# Altium integrated library WCAP-ATG8_rev15a.intlib: 195 symbols (part 2 of 2)
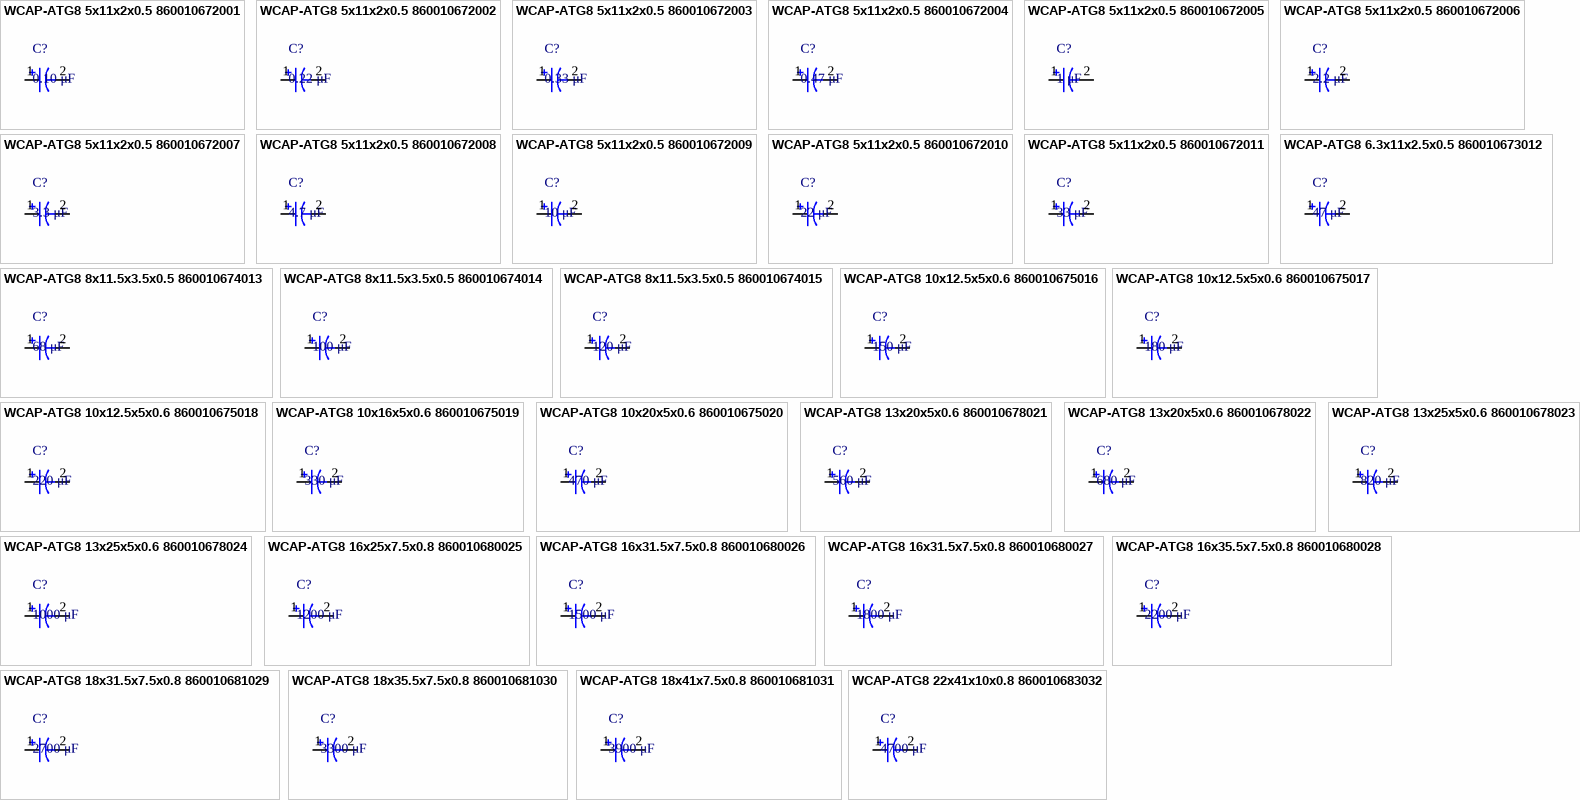
[diagram p7: symbols WCAP-ATG8 5x11x2x0.5 860010672001 to WCAP-ATG8 22x41x10x0.8 860010683032]

## WCAP-ATG8 5x11x2x0.5 860010672007
designator C?, comment 3.3 μF
WCAP-ATG8 Aluminum Electrolytic Capacitors , 3,3 μF; + / - 20%; 50 V , 5 x 11; Manufacturer: Wurth Elektronik; partNo: 860010672007; E-mail: libraries@we-online.com; Characteristics: Aluminum Electrolytic Capacitor; Recommended soldering: Wave; Operating temperature:–40 °C to +85 °C for UR < 400 V; 25 °C to +85 °C for UR ≥ 400 V; Wide capacitance value range; Load life: 2000 h @ +85 °C; ComponentLink1Description: Manufacturer; ComponentLink1URL: http://www.we-online.com; ComponentLink2Description: Datasheet; ComponentLink2URL: http://katalog.we-online.de/pbs/datasheet/860010672007.pdf; Created by: Karrer Zheng; Created Date: 6/8/2015; Capacitance: 3.3 μF; Application: Medium and high voltage type range from 160V-450V used as primary side input filter in power supply; Low voltage type used as energy storage or low frequency filtering in circuit, applied to general switching power supply, AC-DC converter, adapter, charger, TV, VCR, DC motor circuit filter, digital audio, digital cameras, digital video cameras, satellite receiver etc.
footprint WCAP-ATG8 5x11x2x0.5
pins: 1, 2

## WCAP-ATG8 5x11x2x0.5 860010672008
designator C?, comment 4.7 μF
WCAP-ATG8 Aluminum Electrolytic Capacitors , 4,7 μF; + / - 20%; 50 V , 5 x 11; Manufacturer: Wurth Elektronik; partNo: 860010672008; E-mail: libraries@we-online.com; Characteristics: Aluminum Electrolytic Capacitor; Recommended soldering: Wave; Operating temperature:–40 °C to +85 °C for UR < 400 V; 25 °C to +85 °C for UR ≥ 400 V; Wide capacitance value range; Load life: 2000 h @ +85 °C; ComponentLink1Description: Manufacturer; ComponentLink1URL: http://www.we-online.com; ComponentLink2Description: Datasheet; ComponentLink2URL: http://katalog.we-online.de/pbs/datasheet/860010672008.pdf; Created by: Karrer Zheng; Created Date: 6/8/2015; Capacitance: 4.7 μF; Application: Medium and high voltage type range from 160V-450V used as primary side input filter in power supply; Low voltage type used as energy storage or low frequency filtering in circuit, applied to general switching power supply, AC-DC converter, adapter, charger, TV, VCR, DC motor circuit filter, digital audio, digital cameras, digital video cameras, satellite receiver etc.
footprint WCAP-ATG8 5x11x2x0.5
pins: 1, 2

## WCAP-ATG8 5x11x2x0.5 860010672009
designator C?, comment 10 μF
WCAP-ATG8 Aluminum Electrolytic Capacitors , 10 μF; + / - 20%; 50 V , 5 x 11; Manufacturer: Wurth Elektronik; partNo: 860010672009; E-mail: libraries@we-online.com; Characteristics: Aluminum Electrolytic Capacitor; Recommended soldering: Wave; Operating temperature:–40 °C to +85 °C for UR < 400 V; 25 °C to +85 °C for UR ≥ 400 V; Wide capacitance value range; Load life: 2000 h @ +85 °C; ComponentLink1Description: Manufacturer; ComponentLink1URL: http://www.we-online.com; ComponentLink2Description: Datasheet; ComponentLink2URL: http://katalog.we-online.de/pbs/datasheet/860010672009.pdf; Created by: Karrer Zheng; Created Date: 6/8/2015; Capacitance: 10 μF; Application: Medium and high voltage type range from 160V-450V used as primary side input filter in power supply; Low voltage type used as energy storage or low frequency filtering in circuit, applied to general switching power supply, AC-DC converter, adapter, charger, TV, VCR, DC motor circuit filter, digital audio, digital cameras, digital video cameras, satellite receiver etc.
footprint WCAP-ATG8 5x11x2x0.5
pins: 1, 2

## WCAP-ATG8 5x11x2x0.5 860010672010
designator C?, comment 22 μF
WCAP-ATG8 Aluminum Electrolytic Capacitors , 22 μF; + / - 20%; 50 V , 5 x 11; Manufacturer: Wurth Elektronik; partNo: 860010672010; E-mail: libraries@we-online.com; Characteristics: Aluminum Electrolytic Capacitor; Recommended soldering: Wave; Operating temperature:–40 °C to +85 °C for UR < 400 V; 25 °C to +85 °C for UR ≥ 400 V; Wide capacitance value range; Load life: 2000 h @ +85 °C; ComponentLink1Description: Manufacturer; ComponentLink1URL: http://www.we-online.com; ComponentLink2Description: Datasheet; ComponentLink2URL: http://katalog.we-online.de/pbs/datasheet/860010672010.pdf; Created by: Karrer Zheng; Created Date: 6/8/2015; Capacitance: 22 μF; Application: Medium and high voltage type range from 160V-450V used as primary side input filter in power supply; Low voltage type used as energy storage or low frequency filtering in circuit, applied to general switching power supply, AC-DC converter, adapter, charger, TV, VCR, DC motor circuit filter, digital audio, digital cameras, digital video cameras, satellite receiver etc.
footprint WCAP-ATG8 5x11x2x0.5
pins: 1, 2

## WCAP-ATG8 5x11x2x0.5 860010672011
designator C?, comment 33 μF
WCAP-ATG8 Aluminum Electrolytic Capacitors , 33 μF; + / - 20%; 50 V , 5 x 11; Manufacturer: Wurth Elektronik; partNo: 860010672011; E-mail: libraries@we-online.com; Characteristics: Aluminum Electrolytic Capacitor; Recommended soldering: Wave; Operating temperature:–40 °C to +85 °C for UR < 400 V; 25 °C to +85 °C for UR ≥ 400 V; Wide capacitance value range; Load life: 2000 h @ +85 °C; ComponentLink1Description: Manufacturer; ComponentLink1URL: http://www.we-online.com; ComponentLink2Description: Datasheet; ComponentLink2URL: http://katalog.we-online.de/pbs/datasheet/860010672011.pdf; Created by: Karrer Zheng; Created Date: 6/8/2015; Capacitance: 33 μF; Application: Medium and high voltage type range from 160V-450V used as primary side input filter in power supply; Low voltage type used as energy storage or low frequency filtering in circuit, applied to general switching power supply, AC-DC converter, adapter, charger, TV, VCR, DC motor circuit filter, digital audio, digital cameras, digital video cameras, satellite receiver etc.
footprint WCAP-ATG8 5x11x2x0.5
pins: 1, 2

## WCAP-ATG8 6.3x11x2.5x0.5 860010673012
designator C?, comment 47 μF
WCAP-ATG8 Aluminum Electrolytic Capacitors , 47 μF; + / - 20%; 50 V , 6,3 x 11; Manufacturer: Wurth Elektronik; partNo: 860010673012; E-mail: libraries@we-online.com; Characteristics: Aluminum Electrolytic Capacitor; Recommended soldering: Wave; Operating temperature:–40 °C to +85 °C for UR < 400 V; 25 °C to +85 °C for UR ≥ 400 V; Wide capacitance value range; Load life: 2000 h @ +85 °C; ComponentLink1Description: Manufacturer; ComponentLink1URL: http://www.we-online.com; ComponentLink2Description: Datasheet; ComponentLink2URL: http://katalog.we-online.de/pbs/datasheet/860010673012.pdf; Created by: Karrer Zheng; Created Date: 6/8/2015; Capacitance: 47 μF; Application: Medium and high voltage type range from 160V-450V used as primary side input filter in power supply; Low voltage type used as energy storage or low frequency filtering in circuit, applied to general switching power supply, AC-DC converter, adapter, charger, TV, VCR, DC motor circuit filter, digital audio, digital cameras, digital video cameras, satellite receiver etc.
footprint WCAP-ATG8 6.3x11x2.5x0.5
pins: 1, 2

## WCAP-ATG8 8x11.5x3.5x0.5 860010674013
designator C?, comment 68 μF
WCAP-ATG8 Aluminum Electrolytic Capacitors , 68 μF; + / - 20%; 50 V , 8 x 11,5; Manufacturer: Wurth Elektronik; partNo: 860010674013; E-mail: libraries@we-online.com; Characteristics: Aluminum Electrolytic Capacitor; Recommended soldering: Wave; Operating temperature:–40 °C to +85 °C for UR < 400 V; 25 °C to +85 °C for UR ≥ 400 V; Wide capacitance value range; Load life: 2000 h @ +85 °C; ComponentLink1Description: Manufacturer; ComponentLink1URL: http://www.we-online.com; ComponentLink2Description: Datasheet; ComponentLink2URL: http://katalog.we-online.de/pbs/datasheet/860010674013.pdf; Created by: Karrer Zheng; Created Date: 6/8/2015; Capacitance: 68 μF; Application: Medium and high voltage type range from 160V-450V used as primary side input filter in power supply; Low voltage type used as energy storage or low frequency filtering in circuit, applied to general switching power supply, AC-DC converter, adapter, charger, TV, VCR, DC motor circuit filter, digital audio, digital cameras, digital video cameras, satellite receiver etc.
footprint WCAP-ATG8 8x11.5x3.5x0.5
pins: 1, 2

## WCAP-ATG8 8x11.5x3.5x0.5 860010674014
designator C?, comment 100 μF
WCAP-ATG8 Aluminum Electrolytic Capacitors , 100 μF; + / - 20%; 50 V , 8 x 11,5; Manufacturer: Wurth Elektronik; partNo: 860010674014; E-mail: libraries@we-online.com; Characteristics: Aluminum Electrolytic Capacitor; Recommended soldering: Wave; Operating temperature:–40 °C to +85 °C for UR < 400 V; 25 °C to +85 °C for UR ≥ 400 V; Wide capacitance value range; Load life: 2000 h @ +85 °C; ComponentLink1Description: Manufacturer; ComponentLink1URL: http://www.we-online.com; ComponentLink2Description: Datasheet; ComponentLink2URL: http://katalog.we-online.de/pbs/datasheet/860010674014.pdf; Created by: Karrer Zheng; Created Date: 6/8/2015; Capacitance: 100 μF; Application: Medium and high voltage type range from 160V-450V used as primary side input filter in power supply; Low voltage type used as energy storage or low frequency filtering in circuit, applied to general switching power supply, AC-DC converter, adapter, charger, TV, VCR, DC motor circuit filter, digital audio, digital cameras, digital video cameras, satellite receiver etc.
footprint WCAP-ATG8 8x11.5x3.5x0.5
pins: 1, 2

## WCAP-ATG8 8x11.5x3.5x0.5 860010674015
designator C?, comment 120 μF
WCAP-ATG8 Aluminum Electrolytic Capacitors , 120 μF; + / - 20%; 50 V , 8 x 11,5; Manufacturer: Wurth Elektronik; partNo: 860010674015; E-mail: libraries@we-online.com; Characteristics: Aluminum Electrolytic Capacitor; Recommended soldering: Wave; Operating temperature:–40 °C to +85 °C for UR < 400 V; 25 °C to +85 °C for UR ≥ 400 V; Wide capacitance value range; Load life: 2000 h @ +85 °C; ComponentLink1Description: Manufacturer; ComponentLink1URL: http://www.we-online.com; ComponentLink2Description: Datasheet; ComponentLink2URL: http://katalog.we-online.de/pbs/datasheet/860010674015.pdf; Created by: Karrer Zheng; Created Date: 6/8/2015; Capacitance: 120 μF; Application: Medium and high voltage type range from 160V-450V used as primary side input filter in power supply; Low voltage type used as energy storage or low frequency filtering in circuit, applied to general switching power supply, AC-DC converter, adapter, charger, TV, VCR, DC motor circuit filter, digital audio, digital cameras, digital video cameras, satellite receiver etc.
footprint WCAP-ATG8 8x11.5x3.5x0.5
pins: 1, 2

## WCAP-ATG8 10x12.5x5x0.6 860010675016
designator C?, comment 150 μF
WCAP-ATG8 Aluminum Electrolytic Capacitors , 150 μF; + / - 20%; 50 V , 10 x 12,5; Manufacturer: Wurth Elektronik; partNo: 860010675016; E-mail: libraries@we-online.com; Characteristics: Aluminum Electrolytic Capacitor; Recommended soldering: Wave; Operating temperature:–40 °C to +85 °C for UR < 400 V; 25 °C to +85 °C for UR ≥ 400 V; Wide capacitance value range; Load life: 2000 h @ +85 °C; ComponentLink1Description: Manufacturer; ComponentLink1URL: http://www.we-online.com; ComponentLink2Description: Datasheet; ComponentLink2URL: http://katalog.we-online.de/pbs/datasheet/860010675016.pdf; Created by: Karrer Zheng; Created Date: 6/8/2015; Capacitance: 150 μF; Application: Medium and high voltage type range from 160V-450V used as primary side input filter in power supply; Low voltage type used as energy storage or low frequency filtering in circuit, applied to general switching power supply, AC-DC converter, adapter, charger, TV, VCR, DC motor circuit filter, digital audio, digital cameras, digital video cameras, satellite receiver etc.
footprint WCAP-ATG8 10x12.5x5x0.6
pins: 1, 2

## WCAP-ATG8 10x12.5x5x0.6 860010675017
designator C?, comment 180 μF
WCAP-ATG8 Aluminum Electrolytic Capacitors , 180 μF; + / - 20%; 50 V , 10 x 12,5; Manufacturer: Wurth Elektronik; partNo: 860010675017; E-mail: libraries@we-online.com; Characteristics: Aluminum Electrolytic Capacitor; Recommended soldering: Wave; Operating temperature:–40 °C to +85 °C for UR < 400 V; 25 °C to +85 °C for UR ≥ 400 V; Wide capacitance value range; Load life: 2000 h @ +85 °C; ComponentLink1Description: Manufacturer; ComponentLink1URL: http://www.we-online.com; ComponentLink2Description: Datasheet; ComponentLink2URL: http://katalog.we-online.de/pbs/datasheet/860010675017.pdf; Created by: Karrer Zheng; Created Date: 6/8/2015; Capacitance: 180 μF; Application: Medium and high voltage type range from 160V-450V used as primary side input filter in power supply; Low voltage type used as energy storage or low frequency filtering in circuit, applied to general switching power supply, AC-DC converter, adapter, charger, TV, VCR, DC motor circuit filter, digital audio, digital cameras, digital video cameras, satellite receiver etc.
footprint WCAP-ATG8 10x12.5x5x0.6
pins: 1, 2

## WCAP-ATG8 10x12.5x5x0.6 860010675018
designator C?, comment 220 μF
WCAP-ATG8 Aluminum Electrolytic Capacitors , 220 μF; + / - 20%; 50 V , 10 x 12,5; Manufacturer: Wurth Elektronik; partNo: 860010675018; E-mail: libraries@we-online.com; Characteristics: Aluminum Electrolytic Capacitor; Recommended soldering: Wave; Operating temperature:–40 °C to +85 °C for UR < 400 V; 25 °C to +85 °C for UR ≥ 400 V; Wide capacitance value range; Load life: 2000 h @ +85 °C; ComponentLink1Description: Manufacturer; ComponentLink1URL: http://www.we-online.com; ComponentLink2Description: Datasheet; ComponentLink2URL: http://katalog.we-online.de/pbs/datasheet/860010675018.pdf; Created by: Karrer Zheng; Created Date: 6/8/2015; Capacitance: 220 μF; Application: Medium and high voltage type range from 160V-450V used as primary side input filter in power supply; Low voltage type used as energy storage or low frequency filtering in circuit, applied to general switching power supply, AC-DC converter, adapter, charger, TV, VCR, DC motor circuit filter, digital audio, digital cameras, digital video cameras, satellite receiver etc.
footprint WCAP-ATG8 10x12.5x5x0.6
pins: 1, 2

## WCAP-ATG8 10x16x5x0.6 860010675019
designator C?, comment 330 μF
WCAP-ATG8 Aluminum Electrolytic Capacitors , 330 μF; + / - 20%; 50 V , 10 x 16; Manufacturer: Wurth Elektronik; partNo: 860010675019; E-mail: libraries@we-online.com; Characteristics: Aluminum Electrolytic Capacitor; Recommended soldering: Wave; Operating temperature:–40 °C to +85 °C for UR < 400 V; 25 °C to +85 °C for UR ≥ 400 V; Wide capacitance value range; Load life: 2000 h @ +85 °C; ComponentLink1Description: Manufacturer; ComponentLink1URL: http://www.we-online.com; ComponentLink2Description: Datasheet; ComponentLink2URL: http://katalog.we-online.de/pbs/datasheet/860010675019.pdf; Created by: Karrer Zheng; Created Date: 6/8/2015; Capacitance: 330 μF; Application: Medium and high voltage type range from 160V-450V used as primary side input filter in power supply; Low voltage type used as energy storage or low frequency filtering in circuit, applied to general switching power supply, AC-DC converter, adapter, charger, TV, VCR, DC motor circuit filter, digital audio, digital cameras, digital video cameras, satellite receiver etc.
footprint WCAP-ATG8 10x16x5x0.6
pins: 1, 2

## WCAP-ATG8 10x20x5x0.6 860010675020
designator C?, comment 470 μF
WCAP-ATG8 Aluminum Electrolytic Capacitors , 470 μF; + / - 20%; 50 V , 10 x 20; Manufacturer: Wurth Elektronik; partNo: 860010675020; E-mail: libraries@we-online.com; Characteristics: Aluminum Electrolytic Capacitor; Recommended soldering: Wave; Operating temperature:–40 °C to +85 °C for UR < 400 V; 25 °C to +85 °C for UR ≥ 400 V; Wide capacitance value range; Load life: 2000 h @ +85 °C; ComponentLink1Description: Manufacturer; ComponentLink1URL: http://www.we-online.com; ComponentLink2Description: Datasheet; ComponentLink2URL: http://katalog.we-online.de/pbs/datasheet/860010675020.pdf; Created by: Karrer Zheng; Created Date: 6/8/2015; Capacitance: 470 μF; Application: Medium and high voltage type range from 160V-450V used as primary side input filter in power supply; Low voltage type used as energy storage or low frequency filtering in circuit, applied to general switching power supply, AC-DC converter, adapter, charger, TV, VCR, DC motor circuit filter, digital audio, digital cameras, digital video cameras, satellite receiver etc.
footprint WCAP-ATG8 10x20x5x0.6
pins: 1, 2

## WCAP-ATG8 13x20x5x0.6 860010678021
designator C?, comment 560 μF
WCAP-ATG8 Aluminum Electrolytic Capacitors , 560 μF; + / - 20%; 50 V , 13 x 20; Manufacturer: Wurth Elektronik; partNo: 860010678021; E-mail: libraries@we-online.com; Characteristics: Aluminum Electrolytic Capacitor; Recommended soldering: Wave; Operating temperature:–40 °C to +85 °C for UR < 400 V; 25 °C to +85 °C for UR ≥ 400 V; Wide capacitance value range; Load life: 2000 h @ +85 °C; ComponentLink1Description: Manufacturer; ComponentLink1URL: http://www.we-online.com; ComponentLink2Description: Datasheet; ComponentLink2URL: http://katalog.we-online.de/pbs/datasheet/860010678021.pdf; Created by: Karrer Zheng; Created Date: 6/8/2015; Capacitance: 560 μF; Application: Medium and high voltage type range from 160V-450V used as primary side input filter in power supply; Low voltage type used as energy storage or low frequency filtering in circuit, applied to general switching power supply, AC-DC converter, adapter, charger, TV, VCR, DC motor circuit filter, digital audio, digital cameras, digital video cameras, satellite receiver etc.
footprint WCAP-ATG8 13x20x5x0.6
pins: 1, 2

## WCAP-ATG8 13x20x5x0.6 860010678022
designator C?, comment 680 μF
WCAP-ATG8 Aluminum Electrolytic Capacitors , 680 μF; + / - 20%; 50 V , 13 x 20; Manufacturer: Wurth Elektronik; partNo: 860010678022; E-mail: libraries@we-online.com; Characteristics: Aluminum Electrolytic Capacitor; Recommended soldering: Wave; Operating temperature:–40 °C to +85 °C for UR < 400 V; 25 °C to +85 °C for UR ≥ 400 V; Wide capacitance value range; Load life: 2000 h @ +85 °C; ComponentLink1Description: Manufacturer; ComponentLink1URL: http://www.we-online.com; ComponentLink2Description: Datasheet; ComponentLink2URL: http://katalog.we-online.de/pbs/datasheet/860010678022.pdf; Created by: Karrer Zheng; Created Date: 6/8/2015; Capacitance: 680 μF; Application: Medium and high voltage type range from 160V-450V used as primary side input filter in power supply; Low voltage type used as energy storage or low frequency filtering in circuit, applied to general switching power supply, AC-DC converter, adapter, charger, TV, VCR, DC motor circuit filter, digital audio, digital cameras, digital video cameras, satellite receiver etc.
footprint WCAP-ATG8 13x20x5x0.6
pins: 1, 2

## WCAP-ATG8 13x25x5x0.6 860010678023
designator C?, comment 820 μF
WCAP-ATG8 Aluminum Electrolytic Capacitors , 820 μF; + / - 20%; 50 V , 13 x 25; Manufacturer: Wurth Elektronik; partNo: 860010678023; E-mail: libraries@we-online.com; Characteristics: Aluminum Electrolytic Capacitor; Recommended soldering: Wave; Operating temperature:–40 °C to +85 °C for UR < 400 V; 25 °C to +85 °C for UR ≥ 400 V; Wide capacitance value range; Load life: 2000 h @ +85 °C; ComponentLink1Description: Manufacturer; ComponentLink1URL: http://www.we-online.com; ComponentLink2Description: Datasheet; ComponentLink2URL: http://katalog.we-online.de/pbs/datasheet/860010678023.pdf; Created by: Karrer Zheng; Created Date: 6/8/2015; Capacitance: 820 μF; Application: Medium and high voltage type range from 160V-450V used as primary side input filter in power supply; Low voltage type used as energy storage or low frequency filtering in circuit, applied to general switching power supply, AC-DC converter, adapter, charger, TV, VCR, DC motor circuit filter, digital audio, digital cameras, digital video cameras, satellite receiver etc.
footprint WCAP-ATG8 13x25x5x0.6
pins: 1, 2

## WCAP-ATG8 13x25x5x0.6 860010678024
designator C?, comment 1000 μF
WCAP-ATG8 Aluminum Electrolytic Capacitors , 1000 μF; + / - 20%; 50 V , 13 x 25; Manufacturer: Wurth Elektronik; partNo: 860010678024; E-mail: libraries@we-online.com; Characteristics: Aluminum Electrolytic Capacitor; Recommended soldering: Wave; Operating temperature:–40 °C to +85 °C for UR < 400 V; 25 °C to +85 °C for UR ≥ 400 V; Wide capacitance value range; Load life: 2000 h @ +85 °C; ComponentLink1Description: Manufacturer; ComponentLink1URL: http://www.we-online.com; ComponentLink2Description: Datasheet; ComponentLink2URL: http://katalog.we-online.de/pbs/datasheet/860010678024.pdf; Created by: Karrer Zheng; Created Date: 6/8/2015; Capacitance: 1000 μF; Application: Medium and high voltage type range from 160V-450V used as primary side input filter in power supply; Low voltage type used as energy storage or low frequency filtering in circuit, applied to general switching power supply, AC-DC converter, adapter, charger, TV, VCR, DC motor circuit filter, digital audio, digital cameras, digital video cameras, satellite receiver etc.
footprint WCAP-ATG8 13x25x5x0.6
pins: 1, 2

## WCAP-ATG8 16x25x7.5x0.8 860010680025
designator C?, comment 1200 μF
WCAP-ATG8 Aluminum Electrolytic Capacitors , 1200 μF; + / - 20%; 50 V , 16 x 25; Manufacturer: Wurth Elektronik; partNo: 860010680025; E-mail: libraries@we-online.com; Characteristics: Aluminum Electrolytic Capacitor; Recommended soldering: Wave; Operating temperature:–40 °C to +85 °C for UR < 400 V; 25 °C to +85 °C for UR ≥ 400 V; Wide capacitance value range; Load life: 2000 h @ +85 °C; ComponentLink1Description: Manufacturer; ComponentLink1URL: http://www.we-online.com; ComponentLink2Description: Datasheet; ComponentLink2URL: http://katalog.we-online.de/pbs/datasheet/860010680025.pdf; Created by: Karrer Zheng; Created Date: 6/8/2015; Capacitance: 1200 μF; Application: Medium and high voltage type range from 160V-450V used as primary side input filter in power supply; Low voltage type used as energy storage or low frequency filtering in circuit, applied to general switching power supply, AC-DC converter, adapter, charger, TV, VCR, DC motor circuit filter, digital audio, digital cameras, digital video cameras, satellite receiver etc.
footprint WCAP-ATG8 16x25x7.5x0.8
pins: 1, 2

## WCAP-ATG8 16x31.5x7.5x0.8 860010680026
designator C?, comment 1500 μF
WCAP-ATG8 Aluminum Electrolytic Capacitors , 1500 μF; + / - 20%; 50 V , 16 x 31,5; Manufacturer: Wurth Elektronik; partNo: 860010680026; E-mail: libraries@we-online.com; Characteristics: Aluminum Electrolytic Capacitor; Recommended soldering: Wave; Operating temperature:–40 °C to +85 °C for UR < 400 V; 25 °C to +85 °C for UR ≥ 400 V; Wide capacitance value range; Load life: 2000 h @ +85 °C; ComponentLink1Description: Manufacturer; ComponentLink1URL: http://www.we-online.com; ComponentLink2Description: Datasheet; ComponentLink2URL: http://katalog.we-online.de/pbs/datasheet/860010680026.pdf; Created by: Karrer Zheng; Created Date: 6/8/2015; Capacitance: 1500 μF; Application: Medium and high voltage type range from 160V-450V used as primary side input filter in power supply; Low voltage type used as energy storage or low frequency filtering in circuit, applied to general switching power supply, AC-DC converter, adapter, charger, TV, VCR, DC motor circuit filter, digital audio, digital cameras, digital video cameras, satellite receiver etc.
footprint WCAP-ATG8 16x31.5x7.5x0.8
pins: 1, 2

## WCAP-ATG8 16x31.5x7.5x0.8 860010680027
designator C?, comment 1800 μF
WCAP-ATG8 Aluminum Electrolytic Capacitors , 1800 μF; + / - 20%; 50 V , 16 x 31,5; Manufacturer: Wurth Elektronik; partNo: 860010680027; E-mail: libraries@we-online.com; Characteristics: Aluminum Electrolytic Capacitor; Recommended soldering: Wave; Operating temperature:–40 °C to +85 °C for UR < 400 V; 25 °C to +85 °C for UR ≥ 400 V; Wide capacitance value range; Load life: 2000 h @ +85 °C; ComponentLink1Description: Manufacturer; ComponentLink1URL: http://www.we-online.com; ComponentLink2Description: Datasheet; ComponentLink2URL: http://katalog.we-online.de/pbs/datasheet/860010680027.pdf; Created by: Karrer Zheng; Created Date: 6/8/2015; Capacitance: 1800 μF; Application: Medium and high voltage type range from 160V-450V used as primary side input filter in power supply; Low voltage type used as energy storage or low frequency filtering in circuit, applied to general switching power supply, AC-DC converter, adapter, charger, TV, VCR, DC motor circuit filter, digital audio, digital cameras, digital video cameras, satellite receiver etc.
footprint WCAP-ATG8 16x31.5x7.5x0.8
pins: 1, 2

## WCAP-ATG8 16x35.5x7.5x0.8 860010680028
designator C?, comment 2200 μF
WCAP-ATG8 Aluminum Electrolytic Capacitors , 2200 μF; + / - 20%; 50 V , 16 x 35,5; Manufacturer: Wurth Elektronik; partNo: 860010680028; E-mail: libraries@we-online.com; Characteristics: Aluminum Electrolytic Capacitor; Recommended soldering: Wave; Operating temperature:–40 °C to +85 °C for UR < 400 V; 25 °C to +85 °C for UR ≥ 400 V; Wide capacitance value range; Load life: 2000 h @ +85 °C; ComponentLink1Description: Manufacturer; ComponentLink1URL: http://www.we-online.com; ComponentLink2Description: Datasheet; ComponentLink2URL: http://katalog.we-online.de/pbs/datasheet/860010680028.pdf; Created by: Karrer Zheng; Created Date: 6/8/2015; Capacitance: 2200 μF; Application: Medium and high voltage type range from 160V-450V used as primary side input filter in power supply; Low voltage type used as energy storage or low frequency filtering in circuit, applied to general switching power supply, AC-DC converter, adapter, charger, TV, VCR, DC motor circuit filter, digital audio, digital cameras, digital video cameras, satellite receiver etc.
footprint WCAP-ATG8 16x35.5x7.5x0.8
pins: 1, 2

## WCAP-ATG8 18x31.5x7.5x0.8 860010681029
designator C?, comment 2700 μF
WCAP-ATG8 Aluminum Electrolytic Capacitors , 2700 μF; + / - 20%; 50 V , 18 x 31,5; Manufacturer: Wurth Elektronik; partNo: 860010681029; E-mail: libraries@we-online.com; Characteristics: Aluminum Electrolytic Capacitor; Recommended soldering: Wave; Operating temperature:–40 °C to +85 °C for UR < 400 V; 25 °C to +85 °C for UR ≥ 400 V; Wide capacitance value range; Load life: 2000 h @ +85 °C; ComponentLink1Description: Manufacturer; ComponentLink1URL: http://www.we-online.com; ComponentLink2Description: Datasheet; ComponentLink2URL: http://katalog.we-online.de/pbs/datasheet/860010681029.pdf; Created by: Karrer Zheng; Created Date: 6/8/2015; Capacitance: 2700 μF; Application: Medium and high voltage type range from 160V-450V used as primary side input filter in power supply; Low voltage type used as energy storage or low frequency filtering in circuit, applied to general switching power supply, AC-DC converter, adapter, charger, TV, VCR, DC motor circuit filter, digital audio, digital cameras, digital video cameras, satellite receiver etc.
footprint WCAP-ATG8 18x31.5x7.5x0.8
pins: 1, 2

## WCAP-ATG8 18x35.5x7.5x0.8 860010681030
designator C?, comment 3300 μF
WCAP-ATG8 Aluminum Electrolytic Capacitors , 3300 μF; + / - 20%; 50 V , 18 x 35,5; Manufacturer: Wurth Elektronik; partNo: 860010681030; E-mail: libraries@we-online.com; Characteristics: Aluminum Electrolytic Capacitor; Recommended soldering: Wave; Operating temperature:–40 °C to +85 °C for UR < 400 V; 25 °C to +85 °C for UR ≥ 400 V; Wide capacitance value range; Load life: 2000 h @ +85 °C; ComponentLink1Description: Manufacturer; ComponentLink1URL: http://www.we-online.com; ComponentLink2Description: Datasheet; ComponentLink2URL: http://katalog.we-online.de/pbs/datasheet/860010681030.pdf; Created by: Karrer Zheng; Created Date: 6/8/2015; Capacitance: 3300 μF; Application: Medium and high voltage type range from 160V-450V used as primary side input filter in power supply; Low voltage type used as energy storage or low frequency filtering in circuit, applied to general switching power supply, AC-DC converter, adapter, charger, TV, VCR, DC motor circuit filter, digital audio, digital cameras, digital video cameras, satellite receiver etc.
footprint WCAP-ATG8 18x35.5x7.5x0.8
pins: 1, 2

## WCAP-ATG8 18x41x7.5x0.8 860010681031
designator C?, comment 3900 μF
WCAP-ATG8 Aluminum Electrolytic Capacitors , 3900 μF; + / - 20%; 50 V , 18 x 41; Manufacturer: Wurth Elektronik; partNo: 860010681031; E-mail: libraries@we-online.com; Characteristics: Aluminum Electrolytic Capacitor; Recommended soldering: Wave; Operating temperature:–40 °C to +85 °C for UR < 400 V; 25 °C to +85 °C for UR ≥ 400 V; Wide capacitance value range; Load life: 2000 h @ +85 °C; ComponentLink1Description: Manufacturer; ComponentLink1URL: http://www.we-online.com; ComponentLink2Description: Datasheet; ComponentLink2URL: http://katalog.we-online.de/pbs/datasheet/860010681031.pdf; Created by: Karrer Zheng; Created Date: 6/8/2015; Capacitance: 3900 μF; Application: Medium and high voltage type range from 160V-450V used as primary side input filter in power supply; Low voltage type used as energy storage or low frequency filtering in circuit, applied to general switching power supply, AC-DC converter, adapter, charger, TV, VCR, DC motor circuit filter, digital audio, digital cameras, digital video cameras, satellite receiver etc.
footprint WCAP-ATG8 18x41x7.5x0.8
pins: 1, 2

## WCAP-ATG8 22x41x10x0.8 860010683032
designator C?, comment 4700 μF
WCAP-ATG8 Aluminum Electrolytic Capacitors , 4700 μF; + / - 20%; 50 V , 22 x 41; Manufacturer: Wurth Elektronik; partNo: 860010683032; E-mail: libraries@we-online.com; Characteristics: Aluminum Electrolytic Capacitor; Recommended soldering: Wave; Operating temperature:–40 °C to +85 °C for UR < 400 V; 25 °C to +85 °C for UR ≥ 400 V; Wide capacitance value range; Load life: 2000 h @ +85 °C; ComponentLink1Description: Manufacturer; ComponentLink1URL: http://www.we-online.com; ComponentLink2Description: Datasheet; ComponentLink2URL: http://katalog.we-online.de/pbs/datasheet/860010683032.pdf; Created by: Karrer Zheng; Created Date: 6/8/2015; Capacitance: 4700 μF; Application: Medium and high voltage type range from 160V-450V used as primary side input filter in power supply; Low voltage type used as energy storage or low frequency filtering in circuit, applied to general switching power supply, AC-DC converter, adapter, charger, TV, VCR, DC motor circuit filter, digital audio, digital cameras, digital video cameras, satellite receiver etc.
footprint WCAP-ATG8 22x41x10x0.8
pins: 1, 2


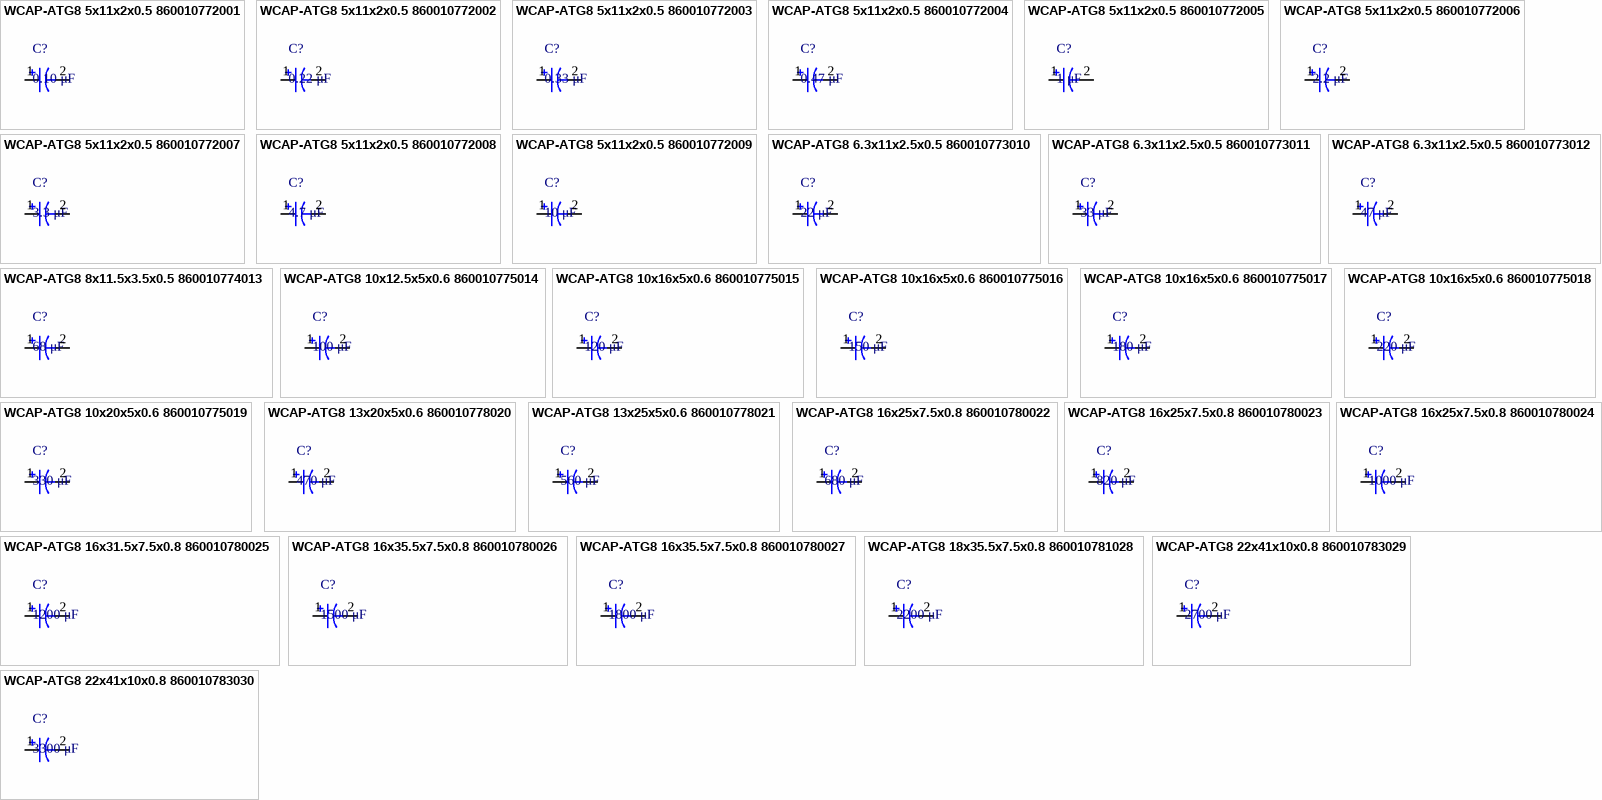
[diagram p4: symbols WCAP-ATG8 5x11x2x0.5 860010772001 to WCAP-ATG8 22x41x10x0.8 860010783030]

## WCAP-ATG8 5x11x2x0.5 860010772001
designator C?, comment 0.10 μF
WCAP-ATG8 Aluminum Electrolytic Capacitors , 0,10 μF; + / - 20%; 63 V , 5 x 11; Manufacturer: Wurth Elektronik; partNo: 860010772001; E-mail: libraries@we-online.com; Characteristics: Aluminum Electrolytic Capacitor; Recommended soldering: Wave; Operating temperature:–40 °C to +85 °C for UR < 400 V; 25 °C to +85 °C for UR ≥ 400 V; Wide capacitance value range; Load life: 2000 h @ +85 °C; ComponentLink1Description: Manufacturer; ComponentLink1URL: http://www.we-online.com; ComponentLink2Description: Datasheet; ComponentLink2URL: http://katalog.we-online.de/pbs/datasheet/860010772001.pdf; Created by: Karrer Zheng; Created Date: 6/8/2015; Capacitance: 0.10 μF; Application: Medium and high voltage type range from 160V-450V used as primary side input filter in power supply; Low voltage type used as energy storage or low frequency filtering in circuit, applied to general switching power supply, AC-DC converter, adapter, charger, TV, VCR, DC motor circuit filter, digital audio, digital cameras, digital video cameras, satellite receiver etc.
footprint WCAP-ATG8 5x11x2x0.5
pins: 1, 2

## WCAP-ATG8 5x11x2x0.5 860010772002
designator C?, comment 0.22 μF
WCAP-ATG8 Aluminum Electrolytic Capacitors , 0,22 μF; + / - 20%; 63 V , 5 x 11; Manufacturer: Wurth Elektronik; partNo: 860010772002; E-mail: libraries@we-online.com; Characteristics: Aluminum Electrolytic Capacitor; Recommended soldering: Wave; Operating temperature:–40 °C to +85 °C for UR < 400 V; 25 °C to +85 °C for UR ≥ 400 V; Wide capacitance value range; Load life: 2000 h @ +85 °C; ComponentLink1Description: Manufacturer; ComponentLink1URL: http://www.we-online.com; ComponentLink2Description: Datasheet; ComponentLink2URL: http://katalog.we-online.de/pbs/datasheet/860010772002.pdf; Created by: Karrer Zheng; Created Date: 6/8/2015; Capacitance: 0.22 μF; Application: Medium and high voltage type range from 160V-450V used as primary side input filter in power supply; Low voltage type used as energy storage or low frequency filtering in circuit, applied to general switching power supply, AC-DC converter, adapter, charger, TV, VCR, DC motor circuit filter, digital audio, digital cameras, digital video cameras, satellite receiver etc.
footprint WCAP-ATG8 5x11x2x0.5
pins: 1, 2

## WCAP-ATG8 5x11x2x0.5 860010772003
designator C?, comment 0.33 μF
WCAP-ATG8 Aluminum Electrolytic Capacitors , 0,33 μF; + / - 20%; 63 V , 5 x 11; Manufacturer: Wurth Elektronik; partNo: 860010772003; E-mail: libraries@we-online.com; Characteristics: Aluminum Electrolytic Capacitor; Recommended soldering: Wave; Operating temperature:–40 °C to +85 °C for UR < 400 V; 25 °C to +85 °C for UR ≥ 400 V; Wide capacitance value range; Load life: 2000 h @ +85 °C; ComponentLink1Description: Manufacturer; ComponentLink1URL: http://www.we-online.com; ComponentLink2Description: Datasheet; ComponentLink2URL: http://katalog.we-online.de/pbs/datasheet/860010772003.pdf; Created by: Karrer Zheng; Created Date: 6/8/2015; Capacitance: 0.33 μF; Application: Medium and high voltage type range from 160V-450V used as primary side input filter in power supply; Low voltage type used as energy storage or low frequency filtering in circuit, applied to general switching power supply, AC-DC converter, adapter, charger, TV, VCR, DC motor circuit filter, digital audio, digital cameras, digital video cameras, satellite receiver etc.
footprint WCAP-ATG8 5x11x2x0.5
pins: 1, 2

## WCAP-ATG8 5x11x2x0.5 860010772004
designator C?, comment 0.47 μF
WCAP-ATG8 Aluminum Electrolytic Capacitors , 0,47 μF; + / - 20%; 63 V , 5 x 11; Manufacturer: Wurth Elektronik; partNo: 860010772004; E-mail: libraries@we-online.com; Characteristics: Aluminum Electrolytic Capacitor; Recommended soldering: Wave; Operating temperature:–40 °C to +85 °C for UR < 400 V; 25 °C to +85 °C for UR ≥ 400 V; Wide capacitance value range; Load life: 2000 h @ +85 °C; ComponentLink1Description: Manufacturer; ComponentLink1URL: http://www.we-online.com; ComponentLink2Description: Datasheet; ComponentLink2URL: http://katalog.we-online.de/pbs/datasheet/860010772004.pdf; Created by: Karrer Zheng; Created Date: 6/8/2015; Capacitance: 0.47 μF; Application: Medium and high voltage type range from 160V-450V used as primary side input filter in power supply; Low voltage type used as energy storage or low frequency filtering in circuit, applied to general switching power supply, AC-DC converter, adapter, charger, TV, VCR, DC motor circuit filter, digital audio, digital cameras, digital video cameras, satellite receiver etc.
footprint WCAP-ATG8 5x11x2x0.5
pins: 1, 2

## WCAP-ATG8 5x11x2x0.5 860010772005
designator C?, comment 1 μF
WCAP-ATG8 Aluminum Electrolytic Capacitors , 1 μF; + / - 20%; 63 V , 5 x 11; Manufacturer: Wurth Elektronik; partNo: 860010772005; E-mail: libraries@we-online.com; Characteristics: Aluminum Electrolytic Capacitor; Recommended soldering: Wave; Operating temperature:–40 °C to +85 °C for UR < 400 V; 25 °C to +85 °C for UR ≥ 400 V; Wide capacitance value range; Load life: 2000 h @ +85 °C; ComponentLink1Description: Manufacturer; ComponentLink1URL: http://www.we-online.com; ComponentLink2Description: Datasheet; ComponentLink2URL: http://katalog.we-online.de/pbs/datasheet/860010772005.pdf; Created by: Karrer Zheng; Created Date: 6/8/2015; Capacitance: 1 μF; Application: Medium and high voltage type range from 160V-450V used as primary side input filter in power supply; Low voltage type used as energy storage or low frequency filtering in circuit, applied to general switching power supply, AC-DC converter, adapter, charger, TV, VCR, DC motor circuit filter, digital audio, digital cameras, digital video cameras, satellite receiver etc.
footprint WCAP-ATG8 5x11x2x0.5
pins: 1, 2

## WCAP-ATG8 5x11x2x0.5 860010772006
designator C?, comment 2.2 μF
WCAP-ATG8 Aluminum Electrolytic Capacitors , 2,2 μF; + / - 20%; 63 V , 5 x 11; Manufacturer: Wurth Elektronik; partNo: 860010772006; E-mail: libraries@we-online.com; Characteristics: Aluminum Electrolytic Capacitor; Recommended soldering: Wave; Operating temperature:–40 °C to +85 °C for UR < 400 V; 25 °C to +85 °C for UR ≥ 400 V; Wide capacitance value range; Load life: 2000 h @ +85 °C; ComponentLink1Description: Manufacturer; ComponentLink1URL: http://www.we-online.com; ComponentLink2Description: Datasheet; ComponentLink2URL: http://katalog.we-online.de/pbs/datasheet/860010772006.pdf; Created by: Karrer Zheng; Created Date: 6/8/2015; Capacitance: 2.2 μF; Application: Medium and high voltage type range from 160V-450V used as primary side input filter in power supply; Low voltage type used as energy storage or low frequency filtering in circuit, applied to general switching power supply, AC-DC converter, adapter, charger, TV, VCR, DC motor circuit filter, digital audio, digital cameras, digital video cameras, satellite receiver etc.
footprint WCAP-ATG8 5x11x2x0.5
pins: 1, 2

## WCAP-ATG8 5x11x2x0.5 860010772007
designator C?, comment 3.3 μF
WCAP-ATG8 Aluminum Electrolytic Capacitors , 3,3 μF; + / - 20%; 63 V , 5 x 11; Manufacturer: Wurth Elektronik; partNo: 860010772007; E-mail: libraries@we-online.com; Characteristics: Aluminum Electrolytic Capacitor; Recommended soldering: Wave; Operating temperature:–40 °C to +85 °C for UR < 400 V; 25 °C to +85 °C for UR ≥ 400 V; Wide capacitance value range; Load life: 2000 h @ +85 °C; ComponentLink1Description: Manufacturer; ComponentLink1URL: http://www.we-online.com; ComponentLink2Description: Datasheet; ComponentLink2URL: http://katalog.we-online.de/pbs/datasheet/860010772007.pdf; Created by: Karrer Zheng; Created Date: 6/8/2015; Capacitance: 3.3 μF; Application: Medium and high voltage type range from 160V-450V used as primary side input filter in power supply; Low voltage type used as energy storage or low frequency filtering in circuit, applied to general switching power supply, AC-DC converter, adapter, charger, TV, VCR, DC motor circuit filter, digital audio, digital cameras, digital video cameras, satellite receiver etc.
footprint WCAP-ATG8 5x11x2x0.5
pins: 1, 2

## WCAP-ATG8 5x11x2x0.5 860010772008
designator C?, comment 4.7 μF
WCAP-ATG8 Aluminum Electrolytic Capacitors , 4,7 μF; + / - 20%; 63 V , 5 x 11; Manufacturer: Wurth Elektronik; partNo: 860010772008; E-mail: libraries@we-online.com; Characteristics: Aluminum Electrolytic Capacitor; Recommended soldering: Wave; Operating temperature:–40 °C to +85 °C for UR < 400 V; 25 °C to +85 °C for UR ≥ 400 V; Wide capacitance value range; Load life: 2000 h @ +85 °C; ComponentLink1Description: Manufacturer; ComponentLink1URL: http://www.we-online.com; ComponentLink2Description: Datasheet; ComponentLink2URL: http://katalog.we-online.de/pbs/datasheet/860010772008.pdf; Created by: Karrer Zheng; Created Date: 6/8/2015; Capacitance: 4.7 μF; Application: Medium and high voltage type range from 160V-450V used as primary side input filter in power supply; Low voltage type used as energy storage or low frequency filtering in circuit, applied to general switching power supply, AC-DC converter, adapter, charger, TV, VCR, DC motor circuit filter, digital audio, digital cameras, digital video cameras, satellite receiver etc.
footprint WCAP-ATG8 5x11x2x0.5
pins: 1, 2

## WCAP-ATG8 5x11x2x0.5 860010772009
designator C?, comment 10 μF
WCAP-ATG8 Aluminum Electrolytic Capacitors , 10 μF; + / - 20%; 63 V , 5 x 11; Manufacturer: Wurth Elektronik; partNo: 860010772009; E-mail: libraries@we-online.com; Characteristics: Aluminum Electrolytic Capacitor; Recommended soldering: Wave; Operating temperature:–40 °C to +85 °C for UR < 400 V; 25 °C to +85 °C for UR ≥ 400 V; Wide capacitance value range; Load life: 2000 h @ +85 °C; ComponentLink1Description: Manufacturer; ComponentLink1URL: http://www.we-online.com; ComponentLink2Description: Datasheet; ComponentLink2URL: http://katalog.we-online.de/pbs/datasheet/860010772009.pdf; Created by: Karrer Zheng; Created Date: 6/8/2015; Capacitance: 10 μF; Application: Medium and high voltage type range from 160V-450V used as primary side input filter in power supply; Low voltage type used as energy storage or low frequency filtering in circuit, applied to general switching power supply, AC-DC converter, adapter, charger, TV, VCR, DC motor circuit filter, digital audio, digital cameras, digital video cameras, satellite receiver etc.
footprint WCAP-ATG8 5x11x2x0.5
pins: 1, 2

## WCAP-ATG8 6.3x11x2.5x0.5 860010773010
designator C?, comment 22 μF
WCAP-ATG8 Aluminum Electrolytic Capacitors , 22 μF; + / - 20%; 63 V , 6,3 x 11; Manufacturer: Wurth Elektronik; partNo: 860010773010; E-mail: libraries@we-online.com; Characteristics: Aluminum Electrolytic Capacitor; Recommended soldering: Wave; Operating temperature:–40 °C to +85 °C for UR < 400 V; 25 °C to +85 °C for UR ≥ 400 V; Wide capacitance value range; Load life: 2000 h @ +85 °C; ComponentLink1Description: Manufacturer; ComponentLink1URL: http://www.we-online.com; ComponentLink2Description: Datasheet; ComponentLink2URL: http://katalog.we-online.de/pbs/datasheet/860010773010.pdf; Created by: Karrer Zheng; Created Date: 6/8/2015; Capacitance: 22 μF; Application: Medium and high voltage type range from 160V-450V used as primary side input filter in power supply; Low voltage type used as energy storage or low frequency filtering in circuit, applied to general switching power supply, AC-DC converter, adapter, charger, TV, VCR, DC motor circuit filter, digital audio, digital cameras, digital video cameras, satellite receiver etc.
footprint WCAP-ATG8 6.3x11x2.5x0.5
pins: 1, 2

## WCAP-ATG8 6.3x11x2.5x0.5 860010773011
designator C?, comment 33 μF
WCAP-ATG8 Aluminum Electrolytic Capacitors , 33 μF; + / - 20%; 63 V , 6,3 x 11; Manufacturer: Wurth Elektronik; partNo: 860010773011; E-mail: libraries@we-online.com; Characteristics: Aluminum Electrolytic Capacitor; Recommended soldering: Wave; Operating temperature:–40 °C to +85 °C for UR < 400 V; 25 °C to +85 °C for UR ≥ 400 V; Wide capacitance value range; Load life: 2000 h @ +85 °C; ComponentLink1Description: Manufacturer; ComponentLink1URL: http://www.we-online.com; ComponentLink2Description: Datasheet; ComponentLink2URL: http://katalog.we-online.de/pbs/datasheet/860010773011.pdf; Created by: Karrer Zheng; Created Date: 6/8/2015; Capacitance: 33 μF; Application: Medium and high voltage type range from 160V-450V used as primary side input filter in power supply; Low voltage type used as energy storage or low frequency filtering in circuit, applied to general switching power supply, AC-DC converter, adapter, charger, TV, VCR, DC motor circuit filter, digital audio, digital cameras, digital video cameras, satellite receiver etc.
footprint WCAP-ATG8 6.3x11x2.5x0.5
pins: 1, 2

## WCAP-ATG8 6.3x11x2.5x0.5 860010773012
designator C?, comment 47 μF
WCAP-ATG8 Aluminum Electrolytic Capacitors , 47 μF; + / - 20%; 63 V , 6,3 x 11; Manufacturer: Wurth Elektronik; partNo: 860010773012; E-mail: libraries@we-online.com; Characteristics: Aluminum Electrolytic Capacitor; Recommended soldering: Wave; Operating temperature:–40 °C to +85 °C for UR < 400 V; 25 °C to +85 °C for UR ≥ 400 V; Wide capacitance value range; Load life: 2000 h @ +85 °C; ComponentLink1Description: Manufacturer; ComponentLink1URL: http://www.we-online.com; ComponentLink2Description: Datasheet; ComponentLink2URL: http://katalog.we-online.de/pbs/datasheet/860010773012.pdf; Created by: Karrer Zheng; Created Date: 6/8/2015; Capacitance: 47 μF; Application: Medium and high voltage type range from 160V-450V used as primary side input filter in power supply; Low voltage type used as energy storage or low frequency filtering in circuit, applied to general switching power supply, AC-DC converter, adapter, charger, TV, VCR, DC motor circuit filter, digital audio, digital cameras, digital video cameras, satellite receiver etc.
footprint WCAP-ATG8 6.3x11x2.5x0.5
pins: 1, 2

## WCAP-ATG8 8x11.5x3.5x0.5 860010774013
designator C?, comment 68 μF
WCAP-ATG8 Aluminum Electrolytic Capacitors , 68 μF; + / - 20%; 63 V , 8 x 11,5; Manufacturer: Wurth Elektronik; partNo: 860010774013; E-mail: libraries@we-online.com; Characteristics: Aluminum Electrolytic Capacitor; Recommended soldering: Wave; Operating temperature:–40 °C to +85 °C for UR < 400 V; 25 °C to +85 °C for UR ≥ 400 V; Wide capacitance value range; Load life: 2000 h @ +85 °C; ComponentLink1Description: Manufacturer; ComponentLink1URL: http://www.we-online.com; ComponentLink2Description: Datasheet; ComponentLink2URL: http://katalog.we-online.de/pbs/datasheet/860010774013.pdf; Created by: Karrer Zheng; Created Date: 6/8/2015; Capacitance: 68 μF; Application: Medium and high voltage type range from 160V-450V used as primary side input filter in power supply; Low voltage type used as energy storage or low frequency filtering in circuit, applied to general switching power supply, AC-DC converter, adapter, charger, TV, VCR, DC motor circuit filter, digital audio, digital cameras, digital video cameras, satellite receiver etc.
footprint WCAP-ATG8 8x11.5x3.5x0.5
pins: 1, 2

## WCAP-ATG8 10x12.5x5x0.6 860010775014
designator C?, comment 100 μF
WCAP-ATG8 Aluminum Electrolytic Capacitors , 100 μF; + / - 20%; 63 V , 10 x 12,5; Manufacturer: Wurth Elektronik; partNo: 860010775014; E-mail: libraries@we-online.com; Characteristics: Aluminum Electrolytic Capacitor; Recommended soldering: Wave; Operating temperature:–40 °C to +85 °C for UR < 400 V; 25 °C to +85 °C for UR ≥ 400 V; Wide capacitance value range; Load life: 2000 h @ +85 °C; ComponentLink1Description: Manufacturer; ComponentLink1URL: http://www.we-online.com; ComponentLink2Description: Datasheet; ComponentLink2URL: http://katalog.we-online.de/pbs/datasheet/860010775014.pdf; Created by: Karrer Zheng; Created Date: 6/8/2015; Capacitance: 100 μF; Application: Medium and high voltage type range from 160V-450V used as primary side input filter in power supply; Low voltage type used as energy storage or low frequency filtering in circuit, applied to general switching power supply, AC-DC converter, adapter, charger, TV, VCR, DC motor circuit filter, digital audio, digital cameras, digital video cameras, satellite receiver etc.
footprint WCAP-ATG8 10x12.5x5x0.6
pins: 1, 2

## WCAP-ATG8 10x16x5x0.6 860010775015
designator C?, comment 120 μF
WCAP-ATG8 Aluminum Electrolytic Capacitors , 120 μF; + / - 20%; 63 V , 10 x 16; Manufacturer: Wurth Elektronik; partNo: 860010775015; E-mail: libraries@we-online.com; Characteristics: Aluminum Electrolytic Capacitor; Recommended soldering: Wave; Operating temperature:–40 °C to +85 °C for UR < 400 V; 25 °C to +85 °C for UR ≥ 400 V; Wide capacitance value range; Load life: 2000 h @ +85 °C; ComponentLink1Description: Manufacturer; ComponentLink1URL: http://www.we-online.com; ComponentLink2Description: Datasheet; ComponentLink2URL: http://katalog.we-online.de/pbs/datasheet/860010775015.pdf; Created by: Karrer Zheng; Created Date: 6/8/2015; Capacitance: 120 μF; Application: Medium and high voltage type range from 160V-450V used as primary side input filter in power supply; Low voltage type used as energy storage or low frequency filtering in circuit, applied to general switching power supply, AC-DC converter, adapter, charger, TV, VCR, DC motor circuit filter, digital audio, digital cameras, digital video cameras, satellite receiver etc.
footprint WCAP-ATG8 10x16x5x0.6
pins: 1, 2

## WCAP-ATG8 10x16x5x0.6 860010775016
designator C?, comment 150 μF
WCAP-ATG8 Aluminum Electrolytic Capacitors , 150 μF; + / - 20%; 63 V , 10 x 16; Manufacturer: Wurth Elektronik; partNo: 860010775016; E-mail: libraries@we-online.com; Characteristics: Aluminum Electrolytic Capacitor; Recommended soldering: Wave; Operating temperature:–40 °C to +85 °C for UR < 400 V; 25 °C to +85 °C for UR ≥ 400 V; Wide capacitance value range; Load life: 2000 h @ +85 °C; ComponentLink1Description: Manufacturer; ComponentLink1URL: http://www.we-online.com; ComponentLink2Description: Datasheet; ComponentLink2URL: http://katalog.we-online.de/pbs/datasheet/860010775016.pdf; Created by: Karrer Zheng; Created Date: 6/8/2015; Capacitance: 150 μF; Application: Medium and high voltage type range from 160V-450V used as primary side input filter in power supply; Low voltage type used as energy storage or low frequency filtering in circuit, applied to general switching power supply, AC-DC converter, adapter, charger, TV, VCR, DC motor circuit filter, digital audio, digital cameras, digital video cameras, satellite receiver etc.
footprint WCAP-ATG8 10x16x5x0.6
pins: 1, 2

## WCAP-ATG8 10x16x5x0.6 860010775017
designator C?, comment 180 μF
WCAP-ATG8 Aluminum Electrolytic Capacitors , 180 μF; + / - 20%; 63 V , 10 x 16; Manufacturer: Wurth Elektronik; partNo: 860010775017; E-mail: libraries@we-online.com; Characteristics: Aluminum Electrolytic Capacitor; Recommended soldering: Wave; Operating temperature:–40 °C to +85 °C for UR < 400 V; 25 °C to +85 °C for UR ≥ 400 V; Wide capacitance value range; Load life: 2000 h @ +85 °C; ComponentLink1Description: Manufacturer; ComponentLink1URL: http://www.we-online.com; ComponentLink2Description: Datasheet; ComponentLink2URL: http://katalog.we-online.de/pbs/datasheet/860010775017.pdf; Created by: Karrer Zheng; Created Date: 6/8/2015; Capacitance: 180 μF; Application: Medium and high voltage type range from 160V-450V used as primary side input filter in power supply; Low voltage type used as energy storage or low frequency filtering in circuit, applied to general switching power supply, AC-DC converter, adapter, charger, TV, VCR, DC motor circuit filter, digital audio, digital cameras, digital video cameras, satellite receiver etc.
footprint WCAP-ATG8 10x16x5x0.6
pins: 1, 2

## WCAP-ATG8 10x16x5x0.6 860010775018
designator C?, comment 220 μF
WCAP-ATG8 Aluminum Electrolytic Capacitors , 220 μF; + / - 20%; 63 V , 10 x 16; Manufacturer: Wurth Elektronik; partNo: 860010775018; E-mail: libraries@we-online.com; Characteristics: Aluminum Electrolytic Capacitor; Recommended soldering: Wave; Operating temperature:–40 °C to +85 °C for UR < 400 V; 25 °C to +85 °C for UR ≥ 400 V; Wide capacitance value range; Load life: 2000 h @ +85 °C; ComponentLink1Description: Manufacturer; ComponentLink1URL: http://www.we-online.com; ComponentLink2Description: Datasheet; ComponentLink2URL: http://katalog.we-online.de/pbs/datasheet/860010775018.pdf; Created by: Karrer Zheng; Created Date: 6/8/2015; Capacitance: 220 μF; Application: Medium and high voltage type range from 160V-450V used as primary side input filter in power supply; Low voltage type used as energy storage or low frequency filtering in circuit, applied to general switching power supply, AC-DC converter, adapter, charger, TV, VCR, DC motor circuit filter, digital audio, digital cameras, digital video cameras, satellite receiver etc.
footprint WCAP-ATG8 10x16x5x0.6
pins: 1, 2

## WCAP-ATG8 10x20x5x0.6 860010775019
designator C?, comment 330 μF
WCAP-ATG8 Aluminum Electrolytic Capacitors , 330 μF; + / - 20%; 63 V , 10 x 20; Manufacturer: Wurth Elektronik; partNo: 860010775019; E-mail: libraries@we-online.com; Characteristics: Aluminum Electrolytic Capacitor; Recommended soldering: Wave; Operating temperature:–40 °C to +85 °C for UR < 400 V; 25 °C to +85 °C for UR ≥ 400 V; Wide capacitance value range; Load life: 2000 h @ +85 °C; ComponentLink1Description: Manufacturer; ComponentLink1URL: http://www.we-online.com; ComponentLink2Description: Datasheet; ComponentLink2URL: http://katalog.we-online.de/pbs/datasheet/860010775019.pdf; Created by: Karrer Zheng; Created Date: 6/8/2015; Capacitance: 330 μF; Application: Medium and high voltage type range from 160V-450V used as primary side input filter in power supply; Low voltage type used as energy storage or low frequency filtering in circuit, applied to general switching power supply, AC-DC converter, adapter, charger, TV, VCR, DC motor circuit filter, digital audio, digital cameras, digital video cameras, satellite receiver etc.
footprint WCAP-ATG8 10x20x5x0.6
pins: 1, 2

## WCAP-ATG8 13x20x5x0.6 860010778020
designator C?, comment 470 μF
WCAP-ATG8 Aluminum Electrolytic Capacitors , 470 μF; + / - 20%; 63 V , 13 x 20; Manufacturer: Wurth Elektronik; partNo: 860010778020; E-mail: libraries@we-online.com; Characteristics: Aluminum Electrolytic Capacitor; Recommended soldering: Wave; Operating temperature:–40 °C to +85 °C for UR < 400 V; 25 °C to +85 °C for UR ≥ 400 V; Wide capacitance value range; Load life: 2000 h @ +85 °C; ComponentLink1Description: Manufacturer; ComponentLink1URL: http://www.we-online.com; ComponentLink2Description: Datasheet; ComponentLink2URL: http://katalog.we-online.de/pbs/datasheet/860010778020.pdf; Created by: Karrer Zheng; Created Date: 6/8/2015; Capacitance: 470 μF; Application: Medium and high voltage type range from 160V-450V used as primary side input filter in power supply; Low voltage type used as energy storage or low frequency filtering in circuit, applied to general switching power supply, AC-DC converter, adapter, charger, TV, VCR, DC motor circuit filter, digital audio, digital cameras, digital video cameras, satellite receiver etc.
footprint WCAP-ATG8 13x20x5x0.6
pins: 1, 2

## WCAP-ATG8 13x25x5x0.6 860010778021
designator C?, comment 560 μF
WCAP-ATG8 Aluminum Electrolytic Capacitors , 560 μF; + / - 20%; 63 V , 13 x 25; Manufacturer: Wurth Elektronik; partNo: 860010778021; E-mail: libraries@we-online.com; Characteristics: Aluminum Electrolytic Capacitor; Recommended soldering: Wave; Operating temperature:–40 °C to +85 °C for UR < 400 V; 25 °C to +85 °C for UR ≥ 400 V; Wide capacitance value range; Load life: 2000 h @ +85 °C; ComponentLink1Description: Manufacturer; ComponentLink1URL: http://www.we-online.com; ComponentLink2Description: Datasheet; ComponentLink2URL: http://katalog.we-online.de/pbs/datasheet/860010778021.pdf; Created by: Karrer Zheng; Created Date: 6/8/2015; Capacitance: 560 μF; Application: Medium and high voltage type range from 160V-450V used as primary side input filter in power supply; Low voltage type used as energy storage or low frequency filtering in circuit, applied to general switching power supply, AC-DC converter, adapter, charger, TV, VCR, DC motor circuit filter, digital audio, digital cameras, digital video cameras, satellite receiver etc.
footprint WCAP-ATG8 13x25x5x0.6
pins: 1, 2
